# Altium footprint library Other.PcbLib: 104 footprints (part 5 of 7)
Each footprint in its own frame and in the unit in brackets; x right, y up, seen from the top. Pads: shape width x height; smd on the part's side, far side on the other; paste and mask are expansions set on the pad; w line width, h text height; cw(c..) or ccw(c..) is an arc to the next point about the centre after c.
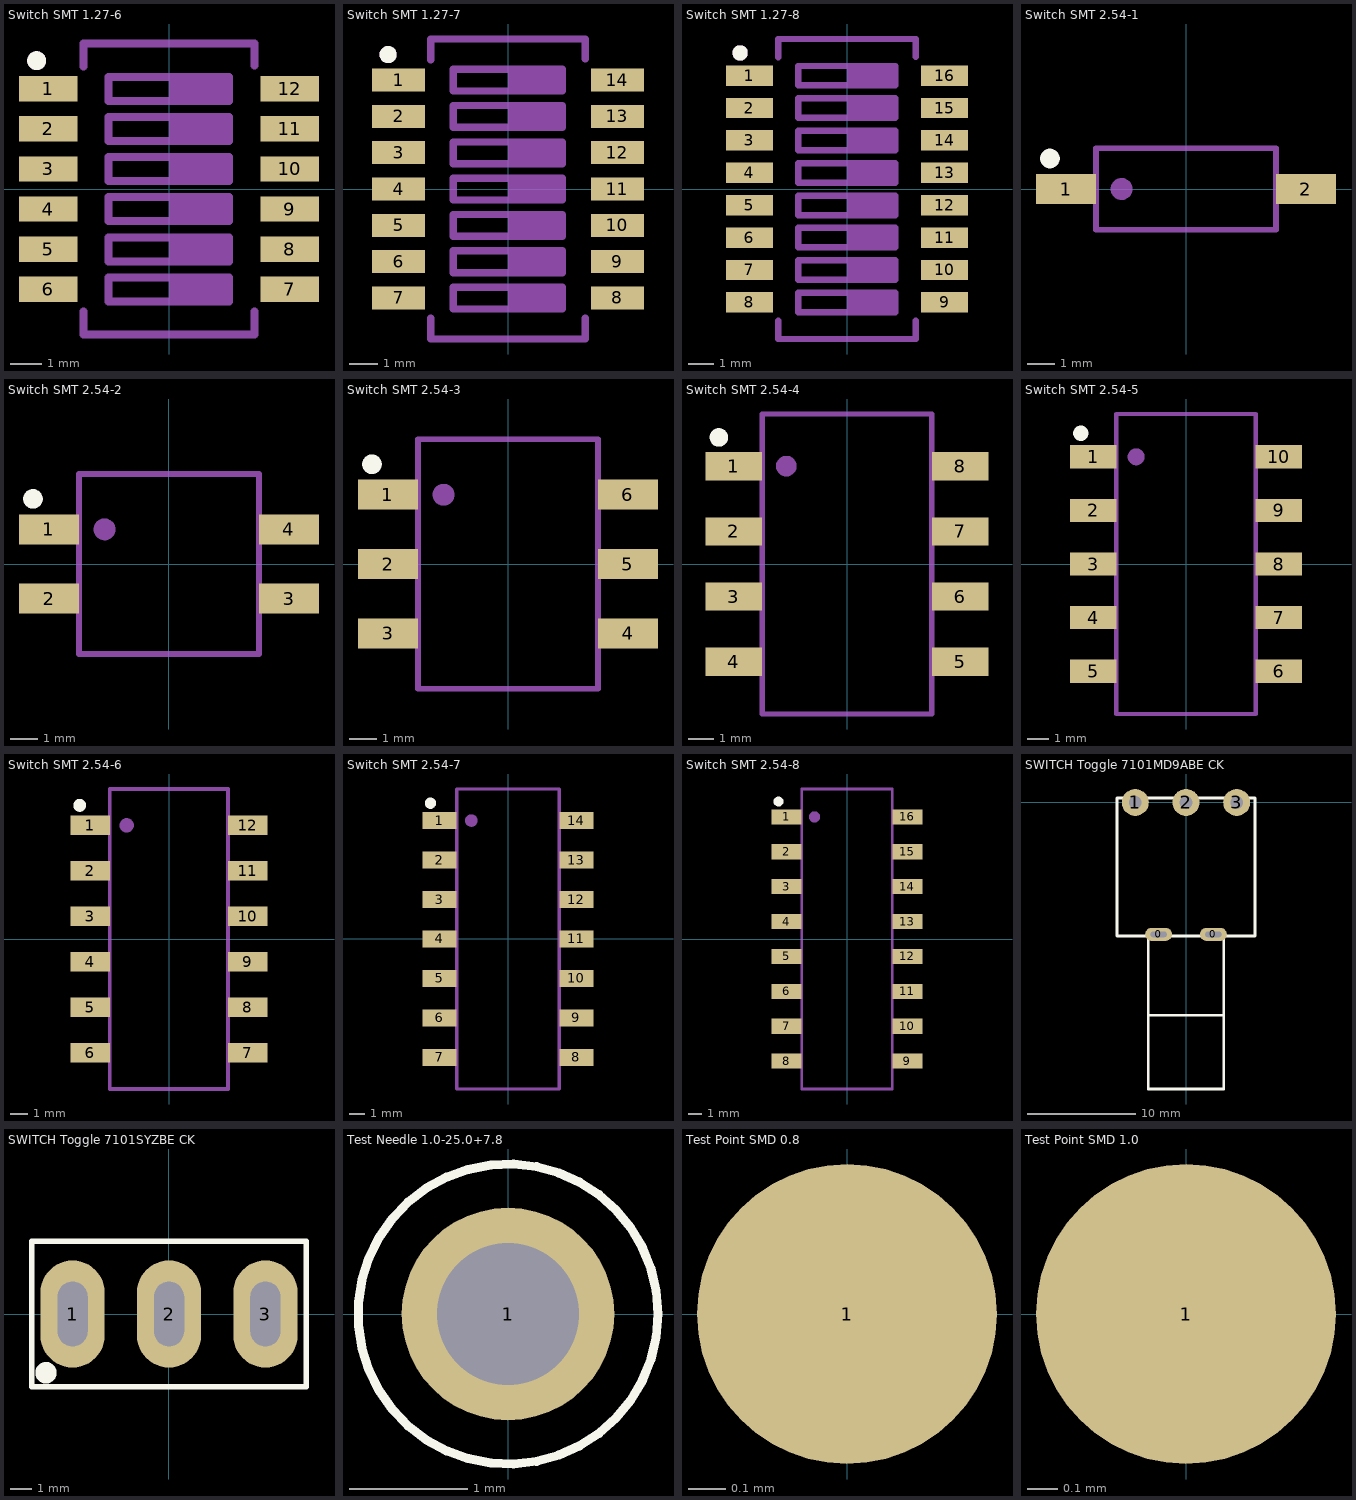
[diagram p4: the footprints below, top view; thin cyan lines are the x and y axes]

## Switch SMT 1.27-6 [mm] "6位拨码开关"
pads (12):
  rect 1.85x0.8 smd: 1(-3.825,3.175) 2(-3.825,1.905) 3(-3.825,0.635) 4(-3.825,-0.635) 5(-3.825,-1.905) 6(-3.825,-3.175) 7(3.825,-3.175) 8(3.825,-1.905) 9(3.825,-0.635) 10(3.825,0.635) 11(3.825,1.905) 12(3.825,3.175)
Top Overlay:
  circle w0.3: c-4.191,4.064 r0.15
Mechanical 15:
  circle w0.3: c-4.191,4.064 r0.15
  region: 0.119,-2.798 0.119,-3.56 1.897,-3.56 1.897,-2.798
  region: 0.119,-1.528 0.119,-2.29 1.897,-2.29 1.897,-1.528
  region: 0.119,3.552 0.119,2.79 1.897,2.79 1.897,3.552
  region: 0.119,2.282 0.119,1.52 1.897,1.52 1.897,2.282
  region: 0.119,1.012 0.119,0.25 1.897,0.25 1.897,1.012
  region: 0.119,-0.258 0.119,-1.02 1.897,-1.02 1.897,-0.258
  lines w0.254: -2.7,-3.886 -2.7,-4.61 2.7,-4.61 2.7,-3.886 ; -2.7,3.886 -2.7,4.61 2.7,4.61 2.7,3.912 ; 0.119,-3.433 0.119,-2.798 ; 0.119,-2.163 0.119,-1.528 ; 0.119,-0.893 0.119,-0.258 ; 0.119,0.377 0.119,1.012 ; 0.119,1.647 0.119,2.282 ; 0.119,2.79 0.119,3.552 ; -1.913,-3.56 1.897,-3.56 1.897,-2.798 -1.913,-2.798 -1.913,-3.56 ; -1.913,-2.29 -1.913,-1.528 1.897,-1.528 1.897,-2.29 -1.913,-2.29 ; -1.913,-1.02 1.897,-1.02 1.897,-0.258 -1.913,-0.258 -1.913,-1.02 ; -1.913,0.25 -1.913,1.012 1.897,1.012 1.897,0.25 -1.913,0.25 ; -1.913,1.52 1.897,1.52 1.897,2.282 -1.913,2.282 -1.913,1.52 ; -1.913,2.79 1.897,2.79 1.897,3.552 -1.913,3.552 -1.913,2.79
3D body: height 2.31, standoff 0.2, extent -1.341,-3.412 -0.807,-2.929
3D body: height 0.2, standoff 0, extent -4.302,-3.369 -3.48,-2.981
3D body: height 0.7, standoff 0, extent -3.683,-3.369 -3.48,-2.981
3D body: height 0.7, standoff 0.5, extent -3.683,-3.369 -2.7,-2.981
3D body: height 0.2, standoff 0, extent 3.472,-3.369 4.294,-2.981
3D body: height 0.7, standoff 0, extent 3.472,-3.369 3.675,-2.981
3D body: height 0.7, standoff 0.5, extent 2.692,-3.369 3.675,-2.981
3D body: height 0.7, standoff 0.5, extent 2.692,-2.099 3.675,-1.711
3D body: height 0.7, standoff 0, extent 3.472,-2.099 3.675,-1.711
3D body: height 0.2, standoff 0, extent 3.472,-2.099 4.294,-1.711
3D body: height 0.7, standoff 0.5, extent -3.683,-2.099 -2.7,-1.711
3D body: height 0.7, standoff 0, extent -3.683,-2.099 -3.48,-1.711
3D body: height 0.2, standoff 0, extent -4.302,-2.099 -3.48,-1.711
3D body: height 2.31, standoff 0.2, extent -1.341,-2.142 -0.807,-1.659
3D body: height 2.31, standoff 0.2, extent -1.341,2.938 -0.807,3.421
3D body: height 2.31, standoff 0.2, extent -1.341,1.668 -0.807,2.151
3D body: height 0.7, standoff 0.5, extent -3.683,2.981 -2.7,3.369
3D body: height 2.3, standoff 0.1, extent -2.7,-4.61 2.7,4.61
3D body: height 0.7, standoff 0, extent -3.683,2.981 -3.48,3.369
3D body: height 0.2, standoff 0, extent -4.302,2.981 -3.48,3.369
3D body: height 0.2, standoff 0, extent -4.302,1.711 -3.48,2.099
3D body: height 0.7, standoff 0, extent -3.683,1.711 -3.48,2.099
3D body: height 0.7, standoff 0.5, extent -3.683,1.711 -2.7,2.099
3D body: height 0.2, standoff 0, extent 3.472,2.981 4.294,3.369
3D body: height 0.7, standoff 0, extent 3.472,2.981 3.675,3.369
3D body: height 0.7, standoff 0.5, extent 2.692,2.991 3.675,3.378
3D body: height 0.2, standoff 0, extent 3.472,1.711 4.294,2.099
3D body: height 0.7, standoff 0, extent 3.472,1.711 3.675,2.099
3D body: height 0.7, standoff 0.5, extent 2.692,1.711 3.675,2.099
3D body: height 0.7, standoff 0.5, extent 2.692,0.441 3.675,0.829
3D body: height 0.7, standoff 0, extent 3.472,0.441 3.675,0.829
3D body: height 0.2, standoff 0, extent 3.472,0.441 4.294,0.829
3D body: height 0.7, standoff 0.5, extent -3.683,0.441 -2.7,0.829
3D body: height 0.7, standoff 0, extent -3.683,0.441 -3.48,0.829
3D body: height 0.2, standoff 0, extent -4.302,0.441 -3.48,0.829
3D body: height 2.31, standoff 0.2, extent -1.341,0.398 -0.807,0.881
3D body: height 2.31, standoff 0.2, extent -1.341,-0.872 -0.807,-0.389
3D body: height 0.2, standoff 0, extent -4.302,-0.829 -3.48,-0.441
3D body: height 0.7, standoff 0, extent -3.683,-0.829 -3.48,-0.441
3D body: height 0.7, standoff 0.5, extent -3.683,-0.829 -2.7,-0.441
3D body: height 0.2, standoff 0, extent 3.472,-0.829 4.294,-0.441
3D body: height 0.7, standoff 0, extent 3.472,-0.829 3.675,-0.441
3D body: height 0.7, standoff 0.5, extent 2.692,-0.829 3.675,-0.441

## Switch SMT 1.27-7 [mm] "7位拨码开关"
pads (14):
  rect 1.85x0.8 smd: 1(-3.825,3.81) 2(-3.825,2.54) 3(-3.825,1.27) 4(-3.825,0) 5(-3.825,-1.27) 6(-3.825,-2.54) 7(-3.825,-3.81) 8(3.825,-3.81) 9(3.825,-2.54) 10(3.825,-1.27) 11(3.825,0) 12(3.825,1.27) 13(3.825,2.54) 14(3.825,3.81)
Top Overlay:
  circle w0.3: c-4.191,4.699 r0.15
Mechanical 15:
  circle w0.3: c-4.191,4.699 r0.15
  region: 0.119,-3.433 0.119,-4.195 1.897,-4.195 1.897,-3.433
  region: 0.119,-2.163 0.119,-2.925 1.897,-2.925 1.897,-2.163
  region: 0.119,-0.893 0.119,-1.655 1.897,-1.655 1.897,-0.893
  region: 0.119,4.187 0.119,3.425 1.897,3.425 1.897,4.187
  region: 0.119,2.917 0.119,2.155 1.897,2.155 1.897,2.917
  region: 0.119,1.647 0.119,0.885 1.897,0.885 1.897,1.647
  region: 0.119,0.377 0.119,-0.385 1.897,-0.385 1.897,0.377
  lines w0.254: -2.7,-4.521 -2.7,-5.245 2.7,-5.245 2.7,-4.521 ; -2.7,4.521 -2.7,5.245 2.7,5.245 2.7,4.547 ; 0.119,-4.068 0.119,-3.433 ; 0.119,-2.798 0.119,-2.163 ; 0.119,-1.528 0.119,-0.893 ; 0.119,-0.258 0.119,0.377 ; 0.119,1.012 0.119,1.647 ; 0.119,2.282 0.119,2.917 ; 0.119,3.425 0.119,4.187 ; -1.913,-4.195 1.897,-4.195 1.897,-3.433 -1.913,-3.433 -1.913,-4.195 ; -1.913,-2.925 1.897,-2.925 1.897,-2.163 -1.913,-2.163 -1.913,-2.925 ; -1.913,-1.655 -1.913,-0.893 1.897,-0.893 1.897,-1.655 -1.913,-1.655 ; -1.913,-0.385 1.897,-0.385 1.897,0.377 -1.913,0.377 -1.913,-0.385 ; -1.913,0.885 -1.913,1.647 1.897,1.647 1.897,0.885 -1.913,0.885 ; -1.913,2.155 1.897,2.155 1.897,2.917 -1.913,2.917 -1.913,2.155 ; -1.913,3.425 1.897,3.425 1.897,4.187 -1.913,4.187 -1.913,3.425
3D body: height 2.31, standoff 0.2, extent -1.341,-4.047 -0.807,-3.564
3D body: height 0.2, standoff 0, extent -4.302,-4.004 -3.48,-3.616
3D body: height 0.7, standoff 0, extent -3.683,-4.004 -3.48,-3.616
3D body: height 0.7, standoff 0.5, extent -3.683,-4.004 -2.7,-3.616
3D body: height 0.2, standoff 0, extent 3.472,-4.004 4.294,-3.616
3D body: height 0.7, standoff 0, extent 3.472,-4.004 3.675,-3.616
3D body: height 0.7, standoff 0.5, extent 2.692,-4.004 3.675,-3.616
3D body: height 2.31, standoff 0.2, extent -1.341,-2.777 -0.807,-2.294
3D body: height 0.2, standoff 0, extent -4.302,-2.734 -3.48,-2.346
3D body: height 0.7, standoff 0, extent -3.683,-2.734 -3.48,-2.346
3D body: height 0.7, standoff 0.5, extent -3.683,-2.734 -2.7,-2.346
3D body: height 0.2, standoff 0, extent 3.472,-2.734 4.294,-2.346
3D body: height 0.7, standoff 0, extent 3.472,-2.734 3.675,-2.346
3D body: height 0.7, standoff 0.5, extent 2.692,-2.734 3.675,-2.346
3D body: height 0.7, standoff 0.5, extent 2.692,-1.464 3.675,-1.076
3D body: height 0.7, standoff 0, extent 3.472,-1.464 3.675,-1.076
3D body: height 0.2, standoff 0, extent 3.472,-1.464 4.294,-1.076
3D body: height 0.7, standoff 0.5, extent -3.683,-1.464 -2.7,-1.076
3D body: height 0.7, standoff 0, extent -3.683,-1.464 -3.48,-1.076
3D body: height 0.2, standoff 0, extent -4.302,-1.464 -3.48,-1.076
3D body: height 2.31, standoff 0.2, extent -1.341,-1.507 -0.807,-1.024
3D body: height 2.31, standoff 0.2, extent -1.341,3.573 -0.807,4.056
3D body: height 2.31, standoff 0.2, extent -1.341,2.303 -0.807,2.786
3D body: height 0.7, standoff 0.5, extent -3.683,3.616 -2.7,4.004
3D body: height 2.3, standoff 0.1, extent -2.7,-5.245 2.7,5.245
3D body: height 0.7, standoff 0, extent -3.683,3.616 -3.48,4.004
3D body: height 0.2, standoff 0, extent -4.302,3.616 -3.48,4.004
3D body: height 0.2, standoff 0, extent -4.302,2.346 -3.48,2.734
3D body: height 0.7, standoff 0, extent -3.683,2.346 -3.48,2.734
3D body: height 0.7, standoff 0.5, extent -3.683,2.346 -2.7,2.734
3D body: height 0.2, standoff 0, extent 3.472,3.616 4.294,4.004
3D body: height 0.7, standoff 0, extent 3.472,3.616 3.675,4.004
3D body: height 0.7, standoff 0.5, extent 2.692,3.626 3.675,4.013
3D body: height 0.2, standoff 0, extent 3.472,2.346 4.294,2.734
3D body: height 0.7, standoff 0, extent 3.472,2.346 3.675,2.734
3D body: height 0.7, standoff 0.5, extent 2.692,2.346 3.675,2.734
3D body: height 0.7, standoff 0.5, extent 2.692,1.076 3.675,1.464
3D body: height 0.7, standoff 0, extent 3.472,1.076 3.675,1.464
3D body: height 0.2, standoff 0, extent 3.472,1.076 4.294,1.464
3D body: height 0.7, standoff 0.5, extent -3.683,1.076 -2.7,1.464
3D body: height 0.7, standoff 0, extent -3.683,1.076 -3.48,1.464
3D body: height 0.2, standoff 0, extent -4.302,1.076 -3.48,1.464
3D body: height 2.31, standoff 0.2, extent -1.341,1.033 -0.807,1.516
3D body: height 2.31, standoff 0.2, extent -1.341,-0.237 -0.807,0.246
3D body: height 0.2, standoff 0, extent -4.302,-0.194 -3.48,0.194
3D body: height 0.7, standoff 0, extent -3.683,-0.194 -3.48,0.194
3D body: height 0.7, standoff 0.5, extent -3.683,-0.194 -2.7,0.194
3D body: height 0.2, standoff 0, extent 3.472,-0.194 4.294,0.194
3D body: height 0.7, standoff 0, extent 3.472,-0.194 3.675,0.194
3D body: height 0.7, standoff 0.5, extent 2.692,-0.194 3.675,0.194

## Switch SMT 1.27-8 [mm] "8位拨码开关"
pads (16):
  rect 1.85x0.8 smd: 1(-3.825,4.445) 2(-3.825,3.175) 3(-3.825,1.905) 4(-3.825,0.635) 5(-3.825,-0.635) 6(-3.825,-1.905) 7(-3.825,-3.175) 8(-3.825,-4.445) 9(3.825,-4.445) 10(3.825,-3.175) 11(3.825,-1.905) 12(3.825,-0.635) 13(3.825,0.635) 14(3.825,1.905) 15(3.825,3.175) 16(3.825,4.445)
Top Overlay:
  circle w0.3: c-4.191,5.334 r0.15
Mechanical 15:
  circle w0.3: c-4.191,5.334 r0.15
  region: 0.119,-4.068 0.119,-4.83 1.897,-4.83 1.897,-4.068
  region: 0.119,-2.798 0.119,-3.56 1.897,-3.56 1.897,-2.798
  region: 0.119,-1.528 0.119,-2.29 1.897,-2.29 1.897,-1.528
  region: 0.119,1.012 0.119,0.25 1.897,0.25 1.897,1.012
  region: 0.119,2.282 0.119,1.52 1.897,1.52 1.897,2.282
  region: 0.119,3.552 0.119,2.79 1.897,2.79 1.897,3.552
  region: 0.119,4.822 0.119,4.06 1.897,4.06 1.897,4.822
  region: 0.119,-0.258 0.119,-1.02 1.897,-1.02 1.897,-0.258
  lines w0.254: -2.7,-5.156 -2.7,-5.88 2.7,-5.88 2.7,-5.156 ; -2.7,5.156 -2.7,5.88 2.7,5.88 2.7,5.182 ; 0.119,-4.703 0.119,-4.068 ; 0.119,-3.433 0.119,-2.798 ; 0.119,-2.163 0.119,-1.528 ; 0.119,-0.893 0.119,-0.258 ; 0.119,0.377 0.119,1.012 ; 0.119,1.647 0.119,2.282 ; 0.119,2.917 0.119,3.552 ; 0.119,4.06 0.119,4.822 ; -1.913,-4.83 1.897,-4.83 1.897,-4.068 -1.913,-4.068 -1.913,-4.83 ; -1.913,-3.56 1.897,-3.56 1.897,-2.798 -1.913,-2.798 -1.913,-3.56 ; -1.913,-2.29 1.897,-2.29 1.897,-1.528 -1.913,-1.528 -1.913,-2.29 ; -1.913,-1.02 1.897,-1.02 1.897,-0.258 -1.913,-0.258 -1.913,-1.02 ; -1.913,0.25 -1.913,1.012 1.897,1.012 1.897,0.25 -1.913,0.25 ; -1.913,1.52 1.897,1.52 1.897,2.282 -1.913,2.282 -1.913,1.52 ; -1.913,2.79 -1.913,3.552 1.897,3.552 1.897,2.79 -1.913,2.79 ; -1.913,4.06 -1.913,4.822 1.897,4.822 1.897,4.06 -1.913,4.06
3D body: height 2.31, standoff 0.2, extent -1.341,-4.682 -0.807,-4.199
3D body: height 0.2, standoff 0, extent -4.302,-4.639 -3.48,-4.251
3D body: height 0.7, standoff 0, extent -3.683,-4.639 -3.48,-4.251
3D body: height 0.7, standoff 0.5, extent -3.683,-4.639 -2.7,-4.251
3D body: height 0.2, standoff 0, extent 3.472,-4.639 4.294,-4.251
3D body: height 0.7, standoff 0, extent 3.472,-4.639 3.675,-4.251
3D body: height 0.7, standoff 0.5, extent 2.692,-4.639 3.675,-4.251
3D body: height 2.31, standoff 0.2, extent -1.341,-3.412 -0.807,-2.929
3D body: height 0.2, standoff 0, extent -4.302,-3.369 -3.48,-2.981
3D body: height 0.7, standoff 0, extent -3.683,-3.369 -3.48,-2.981
3D body: height 0.7, standoff 0.5, extent -3.683,-3.369 -2.7,-2.981
3D body: height 0.2, standoff 0, extent 3.472,-3.369 4.294,-2.981
3D body: height 0.7, standoff 0, extent 3.472,-3.369 3.675,-2.981
3D body: height 0.7, standoff 0.5, extent 2.692,-3.369 3.675,-2.981
3D body: height 2.31, standoff 0.2, extent -1.341,-2.142 -0.807,-1.659
3D body: height 0.2, standoff 0, extent -4.302,-2.099 -3.48,-1.711
3D body: height 0.7, standoff 0, extent -3.683,-2.099 -3.48,-1.711
3D body: height 0.7, standoff 0.5, extent -3.683,-2.099 -2.7,-1.711
3D body: height 0.2, standoff 0, extent 3.472,-2.099 4.294,-1.711
3D body: height 0.7, standoff 0, extent 3.472,-2.099 3.675,-1.711
3D body: height 0.7, standoff 0.5, extent 2.692,-2.099 3.675,-1.711
3D body: height 0.7, standoff 0.5, extent 2.692,0.441 3.675,0.829
3D body: height 0.7, standoff 0, extent 3.472,0.441 3.675,0.829
3D body: height 0.2, standoff 0, extent 3.472,0.441 4.294,0.829
3D body: height 0.7, standoff 0.5, extent -3.683,0.441 -2.7,0.829
3D body: height 0.7, standoff 0, extent -3.683,0.441 -3.48,0.829
3D body: height 0.2, standoff 0, extent -4.302,0.441 -3.48,0.829
3D body: height 2.31, standoff 0.2, extent -1.341,0.398 -0.807,0.881
3D body: height 2.31, standoff 0.2, extent -1.341,1.668 -0.807,2.151
3D body: height 0.2, standoff 0, extent -4.302,1.711 -3.48,2.099
3D body: height 0.7, standoff 0, extent -3.683,1.711 -3.48,2.099
3D body: height 0.7, standoff 0.5, extent -3.683,1.711 -2.7,2.099
3D body: height 0.2, standoff 0, extent 3.472,1.711 4.294,2.099
3D body: height 0.7, standoff 0, extent 3.472,1.711 3.675,2.099
3D body: height 0.7, standoff 0.5, extent 2.692,1.711 3.675,2.099
3D body: height 0.7, standoff 0.5, extent 2.692,2.981 3.675,3.369
3D body: height 0.7, standoff 0, extent 3.472,2.981 3.675,3.369
3D body: height 0.2, standoff 0, extent 3.472,2.981 4.294,3.369
3D body: height 0.7, standoff 0.5, extent 2.692,4.261 3.675,4.648
3D body: height 0.7, standoff 0, extent 3.472,4.251 3.675,4.639
3D body: height 0.2, standoff 0, extent 3.472,4.251 4.294,4.639
3D body: height 0.7, standoff 0.5, extent -3.683,2.981 -2.7,3.369
3D body: height 0.7, standoff 0, extent -3.683,2.981 -3.48,3.369
3D body: height 0.2, standoff 0, extent -4.302,2.981 -3.48,3.369
3D body: height 0.2, standoff 0, extent -4.302,4.251 -3.48,4.639
3D body: height 0.7, standoff 0, extent -3.683,4.251 -3.48,4.639
3D body: height 2.3, standoff 0.1, extent -2.7,-5.88 2.7,5.88
3D body: height 0.7, standoff 0.5, extent -3.683,4.251 -2.7,4.639
3D body: height 2.31, standoff 0.2, extent -1.341,2.938 -0.807,3.421
3D body: height 2.31, standoff 0.2, extent -1.341,4.208 -0.807,4.691
3D body: height 2.31, standoff 0.2, extent -1.341,-0.872 -0.807,-0.389
3D body: height 0.2, standoff 0, extent -4.302,-0.829 -3.48,-0.441
3D body: height 0.7, standoff 0, extent -3.683,-0.829 -3.48,-0.441
3D body: height 0.7, standoff 0.5, extent -3.683,-0.829 -2.7,-0.441
3D body: height 0.2, standoff 0, extent 3.472,-0.829 4.294,-0.441
3D body: height 0.7, standoff 0, extent 3.472,-0.829 3.675,-0.441
3D body: height 0.7, standoff 0.5, extent 2.692,-0.829 3.675,-0.441

## Switch SMT 2.54-1 [mm] "2位拨码开关"
pads (2):
  rect 2.2x1.1 smd: 1(-4.4,0) 2(4.4,0)
Top Overlay:
  circle w0.36: c-4.989,1.118 r0.18
Mechanical 15:
  circle w0.4: c-2.362,0 r0.2
  lines w0.203: -3.3,-1.499 -3.3,1.499 3.3,1.499 3.3,-1.499 -3.3,-1.499
3D body "DIP Switch 2.54-1.stp": height 3.3, standoff 0, extent -4.95,-1.49 4.95,1.49

## Switch SMT 2.54-2 [mm] "2位拨码开关"
pads (4):
  rect 2.2x1.1 smd: 1(-4.4,1.27) 2(-4.4,-1.27) 3(4.4,-1.27) 4(4.4,1.27)
Top Overlay:
  circle w0.36: c-4.989,2.388 r0.18
Mechanical 15:
  circle w0.4: c-2.362,1.27 r0.2
  lines w0.203: -3.3,-3.3 -3.3,3.3 3.3,3.3 3.3,-3.3 -3.3,-3.3
3D body "User Library-DIP SW 2P.STEP": height 4.15, standoff 0, extent -4.95,-3.275 4.95,3.275

## Switch SMT 2.54-3 [mm] "2位拨码开关"
pads (6):
  rect 2.2x1.1 smd: 1(-4.4,2.54) 2(-4.4,0) 3(-4.4,-2.54) 4(4.4,-2.54) 5(4.4,0) 6(4.4,2.54)
Top Overlay:
  circle w0.36: c-4.989,3.658 r0.18
Mechanical 15:
  circle w0.4: c-2.362,2.54 r0.2
  lines w0.203: -3.3,-4.57 3.3,-4.57 3.3,4.57 -3.3,4.57 -3.3,-4.57
3D body "DIP Switch 2.54-3.STEP": height 4.15, standoff 0, extent -4.95,-4.545 4.95,4.545

## Switch SMT 2.54-4 [mm] "2位拨码开关"
pads (8):
  rect 2.2x1.1 smd: 1(-4.4,3.81) 2(-4.4,1.27) 3(-4.4,-1.27) 4(-4.4,-3.81) 5(4.4,-3.81) 6(4.4,-1.27) 7(4.4,1.27) 8(4.4,3.81)
Top Overlay:
  circle w0.36: c-4.989,4.928 r0.18
Mechanical 15:
  circle w0.4: c-2.362,3.81 r0.2
  lines w0.203: -3.3,-5.84 -3.3,5.84 3.3,5.84 3.3,-5.84 ; -3.3,-5.84 3.3,-5.84
3D body "DIP Switch 2.54-4.STEP": height 4.15, standoff 0, extent -4.95,-5.815 4.95,5.815

## Switch SMT 2.54-5 [mm] "2位拨码开关"
pads (10):
  rect 2.2x1.1 smd: 1(-4.4,5.08) 2(-4.4,2.54) 3(-4.4,0) 4(-4.4,-2.54) 5(-4.4,-5.08) 6(4.4,-5.08) 7(4.4,-2.54) 8(4.4,0) 9(4.4,2.54) 10(4.4,5.08)
Top Overlay:
  circle w0.36: c-4.989,6.198 r0.18
Mechanical 15:
  circle w0.4: c-2.363,5.08 r0.2
  lines w0.203: -3.3,-7.11 -3.3,7.11 3.3,7.11 3.3,-7.11 ; -3.3,-7.11 3.3,-7.11
3D body "DIP Switch 2.54-5.STEP": height 4.15, standoff 0, extent -4.95,-7.085 4.95,7.085

## Switch SMT 2.54-6 [mm] "2位拨码开关"
pads (12):
  rect 2.2x1.1 smd: 1(-4.4,6.35) 2(-4.4,3.81) 3(-4.4,1.27) 4(-4.4,-1.27) 5(-4.4,-3.81) 6(-4.4,-6.35) 7(4.4,-6.35) 8(4.4,-3.81) 9(4.4,-1.27) 10(4.4,1.27) 11(4.4,3.81) 12(4.4,6.35)
Top Overlay:
  circle w0.36: c-4.989,7.468 r0.18
Mechanical 15:
  circle w0.4: c-2.363,6.35 r0.2
  lines w0.203: -3.3,-8.38 -3.3,8.38 3.3,8.38 3.3,-8.38 ; -3.3,-8.38 3.3,-8.38
3D body "DIP Switch 2.54-6.STEP": height 4.15, standoff 0, extent -4.95,-8.355 4.95,8.355

## Switch SMT 2.54-7 [mm] "2位拨码开关"
pads (14):
  rect 2.2x1.1 smd: 1(-4.4,7.62) 2(-4.4,5.08) 3(-4.4,2.54) 4(-4.4,0) 5(-4.4,-2.54) 6(-4.4,-5.08) 7(-4.4,-7.62) 8(4.4,-7.62) 9(4.4,-5.08) 10(4.4,-2.54) 11(4.4,0) 12(4.4,2.54) 13(4.4,5.08) 14(4.4,7.62)
Top Overlay:
  circle w0.36: c-4.989,8.738 r0.18
Mechanical 15:
  circle w0.4: c-2.363,7.62 r0.2
  lines w0.203: -3.3,-9.652 -3.3,9.65 3.3,9.65 3.3,-9.652 ; -3.3,-9.65 3.3,-9.65
3D body "DIP Switch 2.54-7.STEP": height 4.15, standoff 0, extent -4.95,-9.625 4.95,9.625

## Switch SMT 2.54-8 [mm] "2位拨码开关"
pads (16):
  rect 2.2x1.1 smd: 1(-4.401,8.89) 2(-4.4,6.35) 3(-4.4,3.81) 4(-4.4,1.27) 5(-4.4,-1.27) 6(-4.4,-3.81) 7(-4.4,-6.35) 8(-4.399,-8.89) 9(4.401,-8.89) 10(4.4,-6.35) 11(4.4,-3.81) 12(4.4,-1.27) 13(4.4,1.27) 14(4.4,3.81) 15(4.4,6.35) 16(4.399,8.89)
Top Overlay:
  circle w0.36: c-4.989,10.008 r0.18
Mechanical 15:
  circle w0.4: c-2.363,8.89 r0.2
  lines w0.203: -3.3,-10.92 -3.3,10.92 3.3,10.92 3.3,-10.92 ; -3.3,-10.92 3.3,-10.92
3D body "DIP Switch 2.54-8.STEP": height 4.15, standoff 0, extent -4.95,-10.895 4.95,10.895

## SWITCH Toggle 7101MD9ABE CK [mm] "单通蓝色乒乓开关"
pads (5):
  oval 2.5x1.2 hole 0.5 slot 1.5 at 0 deg: 0(-2.54,-12.217) 0(2.54,-12.217)
  round 2.5 hole 1.2: 1(-4.7,0) 2(0,0) 3(4.7,0)
Top Overlay:
  lines w0.254: -3.5,-19.71 3.5,-19.71 ; -3.5,-12.37 -3.5,-26.543 3.5,-26.543 3.5,-12.37 ; -6.4,-12.37 -6.4,0.406 6.4,0.406 6.4,-12.37 -6.4,-12.37
3D body "Toggle Switch 7101MD9ABE CK switch.STEP": height 6.93, standoff -2.86, extent -6.35,-26.55 6.35,0.39

## SWITCH Toggle 7101SYZBE CK [mm] "单通蓝色乒乓开关"
pads (3):
  oval 3x5 hole 1.4 slot 3 at 90 deg: 1(-4.5,0) 2(0,0) 3(4.5,0)
Top Overlay:
  circle w0.5: c-5.74,-2.743 r0.25
  lines w0.254: -6.4,-3.4 6.4,-3.4 6.4,3.4 -6.4,3.4 -6.4,-3.4
3D body "7101SYZBE CK switch.STEP": height 28.45, standoff -3.93, extent -6.357,-3.43 6.357,3.43

## Test Needle 1.0-25.0+7.8 [mm]
pads (1):
  round 1.8 hole 1.2: 1(0,0)
Top Overlay:
  circle w0.076: c0,0 r1.27

## Test Point SMD 0.8 [mm]
pads (1):
  round 0.8 smd paste-2: 1(0,0)

## Test Point SMD 1.0 [mm]
pads (1):
  round 1 smd paste-2: 1(0,0)